# Altium footprint library SG_PCB_HOLE_Connector.PcbLib: 133 footprints (part 4 of 9)
Each footprint in its own frame and in the unit in brackets; x right, y up, seen from the top. Pads: shape width x height; smd on the part's side, far side on the other; paste and mask are expansions set on the pad; w line width, h text height; cw(c..) or ccw(c..) is an arc to the next point about the centre after c.
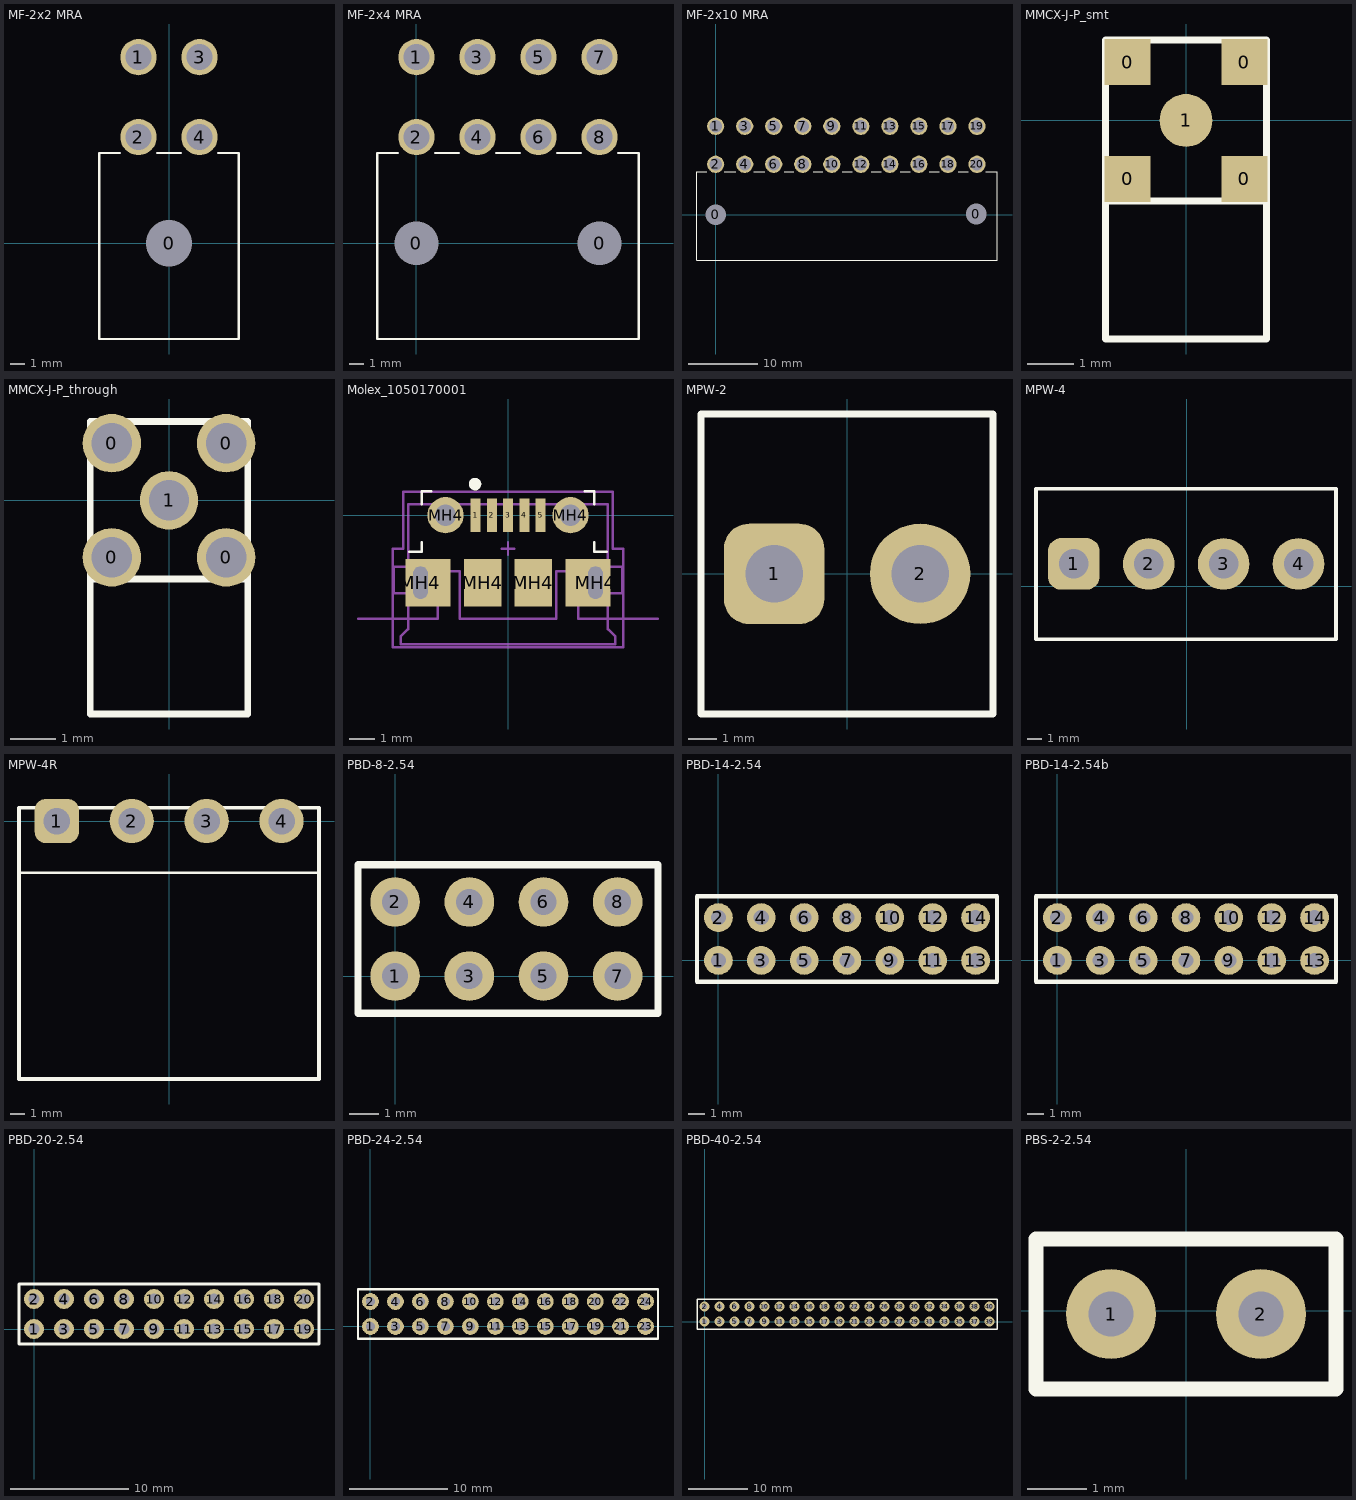
[diagram p3: the footprints below, top view; thin cyan lines are the x and y axes]

## MF-2x2 MRA [mm]
height 12
pads (5):
  round 2.5 hole 3.2 unplated mask+0.05: 0(0,0)
  round 2.5 hole 1.8 mask+0.05: 1(-2.1,12.8) 2(-2.1,7.3) 3(2.1,12.8) 4(2.1,7.3)
Top Overlay:
  lines w0.15: -3.375,6.2 -4.8,6.2 -4.8,-6.6 0.6,-6.6 ; -0.825,6.2 0.6,6.2 ; -0.6,-6.6 4.8,-6.6 4.8,6.2 3.375,6.2 ; -0.6,6.2 0.825,6.2
3D body "Mini-Fit 4pin (MF-4MRA).STEP": height 11.4, standoff -3.6, extent -4.85,-6.66 5.15,13.275

## MF-2x4 MRA [mm]
height 12
pads (10):
  round 2.5 hole 3 unplated mask+0.05: 0(0,0) 0(12.6,0)
  round 2.5 hole 1.8 mask+0.05: 1(0,12.8) 2(0,7.3) 3(4.2,12.8) 4(4.2,7.3) 5(8.4,12.8) 6(8.4,7.3) 7(12.6,12.8) 8(12.6,7.3)
Top Overlay:
  lines w0.15: -1.275,6.2 -2.7,6.2 -2.7,-6.6 2.7,-6.6 ; 1.275,6.2 2.7,6.2 ; 1.5,-6.6 6.9,-6.6 ; 1.5,6.2 2.925,6.2 ; 5.475,6.2 6.9,6.2 ; 5.7,-6.6 11.1,-6.6 ; 5.7,6.2 7.125,6.2 ; 9.675,6.2 11.1,6.2 ; 9.9,-6.6 15.3,-6.6 15.3,6.2 13.875,6.2 ; 9.9,6.2 11.325,6.2
3D body "Mini-Fit 2 pin.STEP": height 11.4, standoff -3.6, extent -2.9,-6.643 2.9,13.292
3D body "Mini-Fit 2 pin.STEP": height 11.4, standoff -3.6, extent 1.3,-6.643 7.1,13.292
3D body "Mini-Fit 2 pin.STEP": height 11.4, standoff -3.6, extent 5.5,-6.643 11.3,13.292
3D body "Mini-Fit 2 pin.STEP": height 11.4, standoff -3.6, extent 9.7,-6.643 15.5,13.292

## MF-2x10 MRA [mm]
height 12
pads (22):
  round 2.5 hole 3 unplated mask+0.05: 0(0,0) 0(37.7,0.1)
  round 2.5 hole 1.8 mask+0.05: 1(0,12.8) 2(0,7.3) 3(4.2,12.8) 4(4.2,7.3) 5(8.4,12.8) 6(8.4,7.3) 7(12.6,12.8) 8(12.6,7.3) 9(16.8,12.8) 10(16.8,7.3) 11(21,12.8) 12(21,7.3) 13(25.2,12.8) 14(25.2,7.3) 15(29.4,12.8) 16(29.4,7.3) 17(33.6,12.8) 18(33.6,7.3) 19(37.8,12.8) 20(37.8,7.3)
Top Overlay:
  lines w0.15: -1.275,6.2 -2.7,6.2 -2.7,-6.6 2.7,-6.6 ; 1.275,6.2 2.7,6.2 ; 1.5,-6.6 6.9,-6.6 ; 1.5,6.2 2.925,6.2 ; 5.475,6.2 6.9,6.2 ; 5.7,-6.6 11.1,-6.6 ; 5.7,6.2 7.125,6.2 ; 9.9,-6.6 40.7,-6.6 40.7,6.2 39.1,6.2 ; 9.9,6.2 11.325,6.2 ; 14.1,6.2 15.525,6.2 ; 18.3,6.2 19.725,6.2 ; 22.5,6.2 23.925,6.2 ; 26.7,6.2 28.125,6.2 ; 30.9,6.2 32.325,6.2 ; 35.1,6.2 36.525,6.2
3D body "mf2x10.stp": height 11.4, standoff -3.6, extent -2.7,-6.535 40.9,13.4

## MMCX-J-P_smt [mm] "rf con"
pads (5):
  rect 1x1 smd: 0(-1.27,-1.27) 0(-1.27,1.27) 0(1.27,-1.27) 0(1.27,1.27)
  round 1.15 smd: 1(0,0)
Top Overlay:
  lines w0.152: -1.75,-1.75 1.75,-1.75 ; -1.75,-4.75 1.75,-4.75 1.75,1.75 -1.75,1.75 -1.75,-4.75
3D body: height 4.6, standoff 0, extent -1.75,-1.75 1.75,1.75
3D body: height 4.6, standoff 1.1, extent -1.75,-4.75 1.75,-1.75

## MMCX-J-P_through [mm] "rf con"
pads (5):
  round 1.3 hole 0.9: 0(-1.27,-1.27) 0(-1.27,1.27) 0(1.27,-1.27) 0(1.27,1.27) 1(0,0)
Top Overlay:
  lines w0.152: -1.75,-1.75 1.75,-1.75 ; -1.75,-4.75 1.75,-4.75 1.75,1.75 -1.75,1.75 -1.75,-4.75
3D body: height 4.6, standoff 0, extent -1.75,-1.75 1.75,1.75
3D body: height 4.6, standoff 1.1, extent -1.75,-4.75 1.75,-1.75

## Molex_1050170001 [mm] "USB Micro-B Connector"
height 2.667
pads (11):
  rect 0.4x1.35 smd: 1(-1.3,0) 2(-0.65,0) 3(0,0) 4(0.65,0) 5(1.3,0)
  rect 1.8x1.9 hole 0.6 slot 1.3 at 90 deg copper offset 0.3,0: MH4(-3.5,-2.7)
  round 1.45 hole 0.85: MH4(-2.5,0) MH4(2.5,0)
  rect 1.5x1.9 smd: MH4(-1,-2.7) MH4(1,-2.7)
  rect 1.8x1.9 hole 0.6 slot 1.3 at 90 deg copper offset -0.3,0: MH4(3.5,-2.7)
Top Overlay:
  circle w0.25: c-1.319,1.245 r0.125
  lines w0.1: -3.953,-1.465 -3.445,-1.465 -3.445,-1.084 ; -3.445,0.44 -3.445,0.948 -3.064,0.948 ; 3.064,0.948 3.445,0.948 3.445,0.44 ; 3.445,-1.084 3.445,-1.465 3.953,-1.465
Top Assembly:
  lines w0.1: -4,0.442 4,0.442 ; -4,0.442 4,0.442 ; -4,0.442 -4,-2.058 -4.572,-2.058 -4.572,-3.116 -4,-3.116 -4,-4.558 -4.3,-4.858 -4.3,-5.158 4.3,-5.158 4.3,-4.858 4,-4.558 4,-3.116 4.572,-3.116 4.572,-2.058 4,-2.058 4,0.442
Board Shape:
  lines w0.1: -6,-4.137 -2.82,-4.137 -2.82,-2.238 -1.92,-2.238 -1.92,-4.137 0,-4.137 1.92,-4.137 1.92,-2.238 2.82,-2.238 2.82,-4.137 6,-4.137
Dimensions:
  text "Board edge" at 5.588,-4.005 h0.2
Top Courtyard:
  lines w0.1: -4.2,0.937 4.2,0.937 ; -4.2,0.94 -4.2,-1.338 -4.6,-1.338 -4.6,-4.137 -4.6,-5.275 4.6,-5.275 4.6,-4.137 4.6,-1.338 4.2,-1.338 4.2,0.94 ; -0.254,-1.338 0.254,-1.338 ; 0,-1.592 0,-1.084
3D body "1050170001.stp": height 2.58, standoff -0.72, extent -4.1,-5.207 4.1,0.193

## MPW-2 [mm]
height 12
pads (2):
  rrect50% 3.5x3.5 hole 2: 1(-2.54,0)
  round 3.5 hole 2: 2(2.54,0)
Top Overlay:
  lines w0.254: -5.085,-4.877 5.075,-4.877 5.075,5.563 -5.085,5.563 -5.085,-4.877
3D body "User Library-MPW-2.step": height 14.17, standoff -3.23, extent -5.055,-4.851 5.105,5.603

## MPW-4 [mm]
height 12
pads (4):
  rrect50% 3.5x3.5 hole 2: 1(-7.66,1.5)
  round 3.5 hole 2: 2(-2.58,1.5) 3(2.5,1.5) 4(7.58,1.5)
Top Overlay:
  lines w0.254: 10.095,-3.605 -10.225,-3.605 -10.225,6.595 10.12,6.595 10.12,-3.605
3D body: height 12.25, standoff 0.5, extent -10.225,-3.605 10.12,6.595

## MPW-4R [mm]
height 12
pads (4):
  rrect50% 3x3 hole 1.8: 1(-7.62,0)
  round 3 hole 1.8: 2(-2.54,0) 3(2.54,0) 4(7.62,0)
Top Overlay:
  lines w0.152: -10.185,-3.5 10.16,-3.5
  lines w0.254: -10.185,-17.5 10.16,-17.5 10.16,0.9 -10.185,0.9 -10.185,-17.5
3D body: height 12.25, standoff 0.5, extent -10.185,-17.5 10.16,0.9

## PBD-8-2.54 [mm]
pads (8):
  round 1.7 hole 0.9: 1(0,0) 2(0,2.54) 3(2.54,0) 4(2.54,2.54) 5(5.08,0) 6(5.08,2.54) 7(7.62,0) 8(7.62,2.54)
Top Overlay:
  lines w0.254: -1.27,-1.27 -1.27,3.81 9,3.81 9,-1.27 -1.27,-1.27
3D body "PBS1-2.54.stp": height 9, standoff -2.65, extent 3.81,1.27 6.35,3.81
3D body "PBS1-2.54.stp": height 9, standoff -2.65, extent 3.81,-1.27 6.35,1.27
3D body "PBS1-2.54.stp": height 9, standoff -2.65, extent 6.35,-1.27 8.89,1.27
3D body "PBS1-2.54.stp": height 9, standoff -2.65, extent 6.35,1.27 8.89,3.81
3D body "PBS1-2.54.stp": height 9, standoff -2.65, extent 1.27,1.27 3.81,3.81
3D body "PBS1-2.54.stp": height 9, standoff -2.65, extent 1.27,-1.27 3.81,1.27
3D body "PBS1-2.54.stp": height 9, standoff -2.65, extent -1.27,-1.27 1.27,1.27
3D body "PBS1-2.54.stp": height 9, standoff -2.65, extent -1.27,1.27 1.27,3.81

## PBD-14-2.54 [mm]
pads (14):
  round 1.7 hole 0.9: 1(0,0) 2(0,2.54) 3(2.54,0) 4(2.54,2.54) 5(5.08,0) 6(5.08,2.54) 7(7.62,0) 8(7.62,2.54) 9(10.16,0) 10(10.16,2.54) 11(12.7,0) 12(12.7,2.54) 13(15.24,0) 14(15.24,2.54)
Top Overlay:
  lines w0.254: -1.27,-1.27 -1.27,3.81 16.51,3.81 16.51,-1.27 -1.27,-1.27
3D body "PBS1-2.54.stp": height 9, standoff -2.65, extent 13.97,1.27 16.51,3.81
3D body "PBS1-2.54.stp": height 9, standoff -2.65, extent 13.97,-1.27 16.51,1.27
3D body "PBS1-2.54.stp": height 9, standoff -2.65, extent 8.89,1.27 11.43,3.81
3D body "PBS1-2.54.stp": height 9, standoff -2.65, extent 8.89,-1.27 11.43,1.27
3D body "PBS1-2.54.stp": height 9, standoff -2.65, extent 11.43,-1.27 13.97,1.27
3D body "PBS1-2.54.stp": height 9, standoff -2.65, extent 11.43,1.27 13.97,3.81
3D body "PBS1-2.54.stp": height 9, standoff -2.65, extent 3.81,1.27 6.35,3.81
3D body "PBS1-2.54.stp": height 9, standoff -2.65, extent 3.81,-1.27 6.35,1.27
3D body "PBS1-2.54.stp": height 9, standoff -2.65, extent 6.35,-1.27 8.89,1.27
3D body "PBS1-2.54.stp": height 9, standoff -2.65, extent 6.35,1.27 8.89,3.81
3D body "PBS1-2.54.stp": height 9, standoff -2.65, extent 1.27,1.27 3.81,3.81
3D body "PBS1-2.54.stp": height 9, standoff -2.65, extent 1.27,-1.27 3.81,1.27
3D body "PBS1-2.54.stp": height 9, standoff -2.65, extent -1.27,-1.27 1.27,1.27
3D body "PBS1-2.54.stp": height 9, standoff -2.65, extent -1.27,1.27 1.27,3.81

## PBD-14-2.54b [mm]
pads (14):
  round 1.7 hole 0.9: 1(0,0) 2(0,2.54) 3(2.54,0) 4(2.54,2.54) 5(5.08,0) 6(5.08,2.54) 7(7.62,0) 8(7.62,2.54) 9(10.16,0) 10(10.16,2.54) 11(12.7,0) 12(12.7,2.54) 13(15.24,0) 14(15.24,2.54)
Top Overlay:
  lines w0.254: -1.27,-1.27 -1.27,3.81 16.51,3.81 16.51,-1.27 -1.27,-1.27
3D body "PBS1-2.54.stp": height 2.65, standoff -9, extent 13.97,1.27 16.51,3.81
3D body "PBS1-2.54.stp": height 2.65, standoff -9, extent 13.97,-1.27 16.51,1.27
3D body "PBS1-2.54.stp": height 2.65, standoff -9, extent 8.89,1.27 11.43,3.81
3D body "PBS1-2.54.stp": height 2.65, standoff -9, extent 8.89,-1.27 11.43,1.27
3D body "PBS1-2.54.stp": height 2.65, standoff -9, extent 11.43,-1.27 13.97,1.27
3D body "PBS1-2.54.stp": height 2.65, standoff -9, extent 11.43,1.27 13.97,3.81
3D body "PBS1-2.54.stp": height 2.65, standoff -9, extent 3.81,1.27 6.35,3.81
3D body "PBS1-2.54.stp": height 2.65, standoff -9, extent 3.81,-1.27 6.35,1.27
3D body "PBS1-2.54.stp": height 2.65, standoff -9, extent 6.35,-1.27 8.89,1.27
3D body "PBS1-2.54.stp": height 2.65, standoff -9, extent 6.35,1.27 8.89,3.81
3D body "PBS1-2.54.stp": height 2.65, standoff -9, extent 1.27,1.27 3.81,3.81
3D body "PBS1-2.54.stp": height 2.65, standoff -9, extent 1.27,-1.27 3.81,1.27
3D body "PBS1-2.54.stp": height 2.65, standoff -9, extent -1.27,-1.27 1.27,1.27
3D body "PBS1-2.54.stp": height 2.65, standoff -9, extent -1.27,1.27 1.27,3.81

## PBD-20-2.54 [mm]
pads (20):
  round 1.7 hole 0.9: 1(0,0) 2(0,2.54) 3(2.54,0) 4(2.54,2.54) 5(5.08,0) 6(5.08,2.54) 7(7.62,0) 8(7.62,2.54) 9(10.16,0) 10(10.16,2.54) 11(12.7,0) 12(12.7,2.54) 13(15.24,0) 14(15.24,2.54) 15(17.78,0) 16(17.78,2.54) 17(20.32,0) 18(20.32,2.54) 19(22.86,0) 20(22.86,2.54)
Top Overlay:
  lines w0.254: -1.27,-1.27 -1.27,3.81 24.13,3.81 24.13,-1.27 -1.27,-1.27
3D body "PBS1-2.54.stp": height 9, standoff -2.65, extent 19.05,1.27 21.59,3.81
3D body "PBS1-2.54.stp": height 9, standoff -2.65, extent 19.05,-1.27 21.59,1.27
3D body "PBS1-2.54.stp": height 9, standoff -2.65, extent 21.59,-1.27 24.13,1.27
3D body "PBS1-2.54.stp": height 9, standoff -2.65, extent 21.59,1.27 24.13,3.81
3D body "PBS1-2.54.stp": height 9, standoff -2.65, extent 13.97,1.27 16.51,3.81
3D body "PBS1-2.54.stp": height 9, standoff -2.65, extent 13.97,-1.27 16.51,1.27
3D body "PBS1-2.54.stp": height 9, standoff -2.65, extent 16.51,-1.27 19.05,1.27
3D body "PBS1-2.54.stp": height 9, standoff -2.65, extent 16.51,1.27 19.05,3.81
3D body "PBS1-2.54.stp": height 9, standoff -2.65, extent 8.89,1.27 11.43,3.81
3D body "PBS1-2.54.stp": height 9, standoff -2.65, extent 8.89,-1.27 11.43,1.27
3D body "PBS1-2.54.stp": height 9, standoff -2.65, extent 11.43,-1.27 13.97,1.27
3D body "PBS1-2.54.stp": height 9, standoff -2.65, extent 11.43,1.27 13.97,3.81
3D body "PBS1-2.54.stp": height 9, standoff -2.65, extent 3.81,1.27 6.35,3.81
3D body "PBS1-2.54.stp": height 9, standoff -2.65, extent 3.81,-1.27 6.35,1.27
3D body "PBS1-2.54.stp": height 9, standoff -2.65, extent 6.35,-1.27 8.89,1.27
3D body "PBS1-2.54.stp": height 9, standoff -2.65, extent 6.35,1.27 8.89,3.81
3D body "PBS1-2.54.stp": height 9, standoff -2.65, extent 1.27,1.27 3.81,3.81
3D body "PBS1-2.54.stp": height 9, standoff -2.65, extent 1.27,-1.27 3.81,1.27
3D body "PBS1-2.54.stp": height 9, standoff -2.65, extent -1.27,-1.27 1.27,1.27
3D body "PBS1-2.54.stp": height 9, standoff -2.65, extent -1.27,1.27 1.27,3.81

## PBD-24-2.54 [mm]
pads (24):
  round 1.7 hole 0.9: 1(0,0) 2(0,2.54) 3(2.54,0) 4(2.54,2.54) 5(5.08,0) 6(5.08,2.54) 7(7.62,0) 8(7.62,2.54) 9(10.16,0) 10(10.16,2.54) 11(12.7,0) 12(12.7,2.54) 13(15.24,0) 14(15.24,2.54) 15(17.78,0) 16(17.78,2.54) 17(20.32,0) 18(20.32,2.54) 19(22.86,0) 20(22.86,2.54) 21(25.425,0) 22(25.425,2.54) 23(27.965,0) 24(27.965,2.54)
Top Overlay:
  lines w0.254: -1.27,-1.27 -1.27,3.81 29.235,3.81 29.235,-1.27 -1.27,-1.27
3D body "PBS1-2.54.stp": height 9, standoff -2.65, extent 21.59,-1.27 24.13,1.27
3D body "PBS1-2.54.stp": height 9, standoff -2.65, extent 21.59,1.27 24.13,3.81
3D body "PBS1-2.54.stp": height 9, standoff -2.65, extent 13.97,1.27 16.51,3.81
3D body "PBS1-2.54.stp": height 9, standoff -2.65, extent 13.97,-1.27 16.51,1.27
3D body "PBS1-2.54.stp": height 9, standoff -2.65, extent 16.51,-1.27 19.05,1.27
3D body "PBS1-2.54.stp": height 9, standoff -2.65, extent 16.51,1.27 19.05,3.81
3D body "PBS1-2.54.stp": height 9, standoff -2.65, extent 8.89,1.27 11.43,3.81
3D body "PBS1-2.54.stp": height 9, standoff -2.65, extent 8.89,-1.27 11.43,1.27
3D body "PBS1-2.54.stp": height 9, standoff -2.65, extent 11.43,-1.27 13.97,1.27
3D body "PBS1-2.54.stp": height 9, standoff -2.65, extent 11.43,1.27 13.97,3.81
3D body "PBS1-2.54.stp": height 9, standoff -2.65, extent 3.81,1.27 6.35,3.81
3D body "PBS1-2.54.stp": height 9, standoff -2.65, extent 3.81,-1.27 6.35,1.27
3D body "PBS1-2.54.stp": height 9, standoff -2.65, extent 6.35,-1.27 8.89,1.27
3D body "PBS1-2.54.stp": height 9, standoff -2.65, extent 6.35,1.27 8.89,3.81
3D body "PBS1-2.54.stp": height 9, standoff -2.65, extent 1.27,1.27 3.81,3.81
3D body "PBS1-2.54.stp": height 9, standoff -2.65, extent 1.27,-1.27 3.81,1.27
3D body "PBS1-2.54.stp": height 9, standoff -2.65, extent -1.27,-1.27 1.27,1.27
3D body "PBS1-2.54.stp": height 9, standoff -2.65, extent -1.27,1.27 1.27,3.81
3D body "PBS1-2.54.stp": height 9, standoff -2.65, extent 26.67,1.27 29.21,3.81
3D body "PBS1-2.54.stp": height 9, standoff -2.65, extent 26.67,-1.27 29.21,1.27
3D body "PBS1-2.54.stp": height 9, standoff -2.65, extent 24.13,-1.27 26.67,1.27
3D body "PBS1-2.54.stp": height 9, standoff -2.65, extent 24.13,1.27 26.67,3.81
3D body "PBS1-2.54.stp": height 9, standoff -2.65, extent 19.05,1.27 21.59,3.81
3D body "PBS1-2.54.stp": height 9, standoff -2.65, extent 19.05,-1.27 21.59,1.27

## PBD-40-2.54 [mm]
pads (40):
  round 1.7 hole 0.9: 1(0,0) 2(0,2.54) 3(2.54,0) 4(2.54,2.54) 5(5.08,0) 6(5.08,2.54) 7(7.62,0) 8(7.62,2.54) 9(10.16,0) 10(10.16,2.54) 11(12.7,0) 12(12.7,2.54) 13(15.24,0) 14(15.24,2.54) 15(17.78,0) 16(17.78,2.54) 17(20.32,0) 18(20.32,2.54) 19(22.86,0) 20(22.86,2.54) 21(25.4,0) 22(25.4,2.54) 23(27.94,0) 24(27.94,2.54) 25(30.48,0) 26(30.48,2.54) 27(33.02,0) 28(33.02,2.54) 29(35.56,0) 30(35.56,2.54) 31(38.1,0) 32(38.1,2.54) 33(40.64,0) 34(40.64,2.54) 35(43.18,0) 36(43.18,2.54) 37(45.72,0) 38(45.72,2.54) 39(48.26,0) 40(48.26,2.54)
Top Overlay:
  lines w0.254: -1.27,-1.27 -1.27,3.81 24.13,3.81 49.53,3.81 49.53,-1.27 24.13,-1.27 -1.27,-1.27
3D body "PBS1-2.54.stp": height 9, standoff -2.65, extent 8.89,-1.27 11.43,1.27
3D body "PBS1-2.54.stp": height 9, standoff -2.65, extent 11.43,-1.27 13.97,1.27
3D body "PBS1-2.54.stp": height 9, standoff -2.65, extent 11.43,1.27 13.97,3.81
3D body "PBS1-2.54.stp": height 9, standoff -2.65, extent 3.81,1.27 6.35,3.81
3D body "PBS1-2.54.stp": height 9, standoff -2.65, extent 3.81,-1.27 6.35,1.27
3D body "PBS1-2.54.stp": height 9, standoff -2.65, extent 6.35,-1.27 8.89,1.27
3D body "PBS1-2.54.stp": height 9, standoff -2.65, extent 6.35,1.27 8.89,3.81
3D body "PBS1-2.54.stp": height 9, standoff -2.65, extent 1.27,1.27 3.81,3.81
3D body "PBS1-2.54.stp": height 9, standoff -2.65, extent 1.27,-1.27 3.81,1.27
3D body "PBS1-2.54.stp": height 9, standoff -2.65, extent -1.27,-1.27 1.27,1.27
3D body "PBS1-2.54.stp": height 9, standoff -2.65, extent -1.27,1.27 1.27,3.81
3D body "PBS1-2.54.stp": height 9, standoff -2.65, extent 24.13,1.27 26.67,3.81
3D body "PBS1-2.54.stp": height 9, standoff -2.65, extent 24.13,-1.27 26.67,1.27
3D body "PBS1-2.54.stp": height 9, standoff -2.65, extent 26.67,-1.27 29.21,1.27
3D body "PBS1-2.54.stp": height 9, standoff -2.65, extent 26.67,1.27 29.21,3.81
3D body "PBS1-2.54.stp": height 9, standoff -2.65, extent 31.75,1.27 34.29,3.81
3D body "PBS1-2.54.stp": height 9, standoff -2.65, extent 31.75,-1.27 34.29,1.27
3D body "PBS1-2.54.stp": height 9, standoff -2.65, extent 29.21,-1.27 31.75,1.27
3D body "PBS1-2.54.stp": height 9, standoff -2.65, extent 29.21,1.27 31.75,3.81
3D body "PBS1-2.54.stp": height 9, standoff -2.65, extent 36.83,1.27 39.37,3.81
3D body "PBS1-2.54.stp": height 9, standoff -2.65, extent 36.83,-1.27 39.37,1.27
3D body "PBS1-2.54.stp": height 9, standoff -2.65, extent 34.29,-1.27 36.83,1.27
3D body "PBS1-2.54.stp": height 9, standoff -2.65, extent 34.29,1.27 36.83,3.81
3D body "PBS1-2.54.stp": height 9, standoff -2.65, extent 41.91,1.27 44.45,3.81
3D body "PBS1-2.54.stp": height 9, standoff -2.65, extent 41.91,-1.27 44.45,1.27
3D body "PBS1-2.54.stp": height 9, standoff -2.65, extent 39.37,-1.27 41.91,1.27
3D body "PBS1-2.54.stp": height 9, standoff -2.65, extent 39.37,1.27 41.91,3.81
3D body "PBS1-2.54.stp": height 9, standoff -2.65, extent 46.99,1.27 49.53,3.81
3D body "PBS1-2.54.stp": height 9, standoff -2.65, extent 46.99,-1.27 49.53,1.27
3D body "PBS1-2.54.stp": height 9, standoff -2.65, extent 44.45,-1.27 46.99,1.27
3D body "PBS1-2.54.stp": height 9, standoff -2.65, extent 44.45,1.27 46.99,3.81
3D body "PBS1-2.54.stp": height 9, standoff -2.65, extent 19.05,1.27 21.59,3.81
3D body "PBS1-2.54.stp": height 9, standoff -2.65, extent 19.05,-1.27 21.59,1.27
3D body "PBS1-2.54.stp": height 9, standoff -2.65, extent 21.59,-1.27 24.13,1.27
3D body "PBS1-2.54.stp": height 9, standoff -2.65, extent 21.59,1.27 24.13,3.81
3D body "PBS1-2.54.stp": height 9, standoff -2.65, extent 13.97,1.27 16.51,3.81
3D body "PBS1-2.54.stp": height 9, standoff -2.65, extent 13.97,-1.27 16.51,1.27
3D body "PBS1-2.54.stp": height 9, standoff -2.65, extent 16.51,-1.27 19.05,1.27
3D body "PBS1-2.54.stp": height 9, standoff -2.65, extent 16.51,1.27 19.05,3.81
3D body "PBS1-2.54.stp": height 9, standoff -2.65, extent 8.89,1.27 11.43,3.81

## PBS-2-2.54 [mil]
pads (2):
  round 60 hole 30: 1(-50,-2) 2(50,-2)
Top Overlay:
  lines w10: -100,-52 -100,48 100,48 100,-52 -100,-52
3D body "PBS1-2.54.stp": height 334.65, standoff -124.02, extent 0,-52 100,48
3D body "PBS1-2.54.stp": height 334.65, standoff -124.02, extent -100,-52 0,48